# Altium footprint library LDCN Components.PcbLib: 426 footprints (part 17 of 27)
Each footprint in its own frame and in the unit in brackets; x right, y up, seen from the top. Pads: shape width x height; smd on the part's side, far side on the other; paste and mask are expansions set on the pad; w line width, h text height; cw(c..) or ccw(c..) is an arc to the next point about the centre after c.
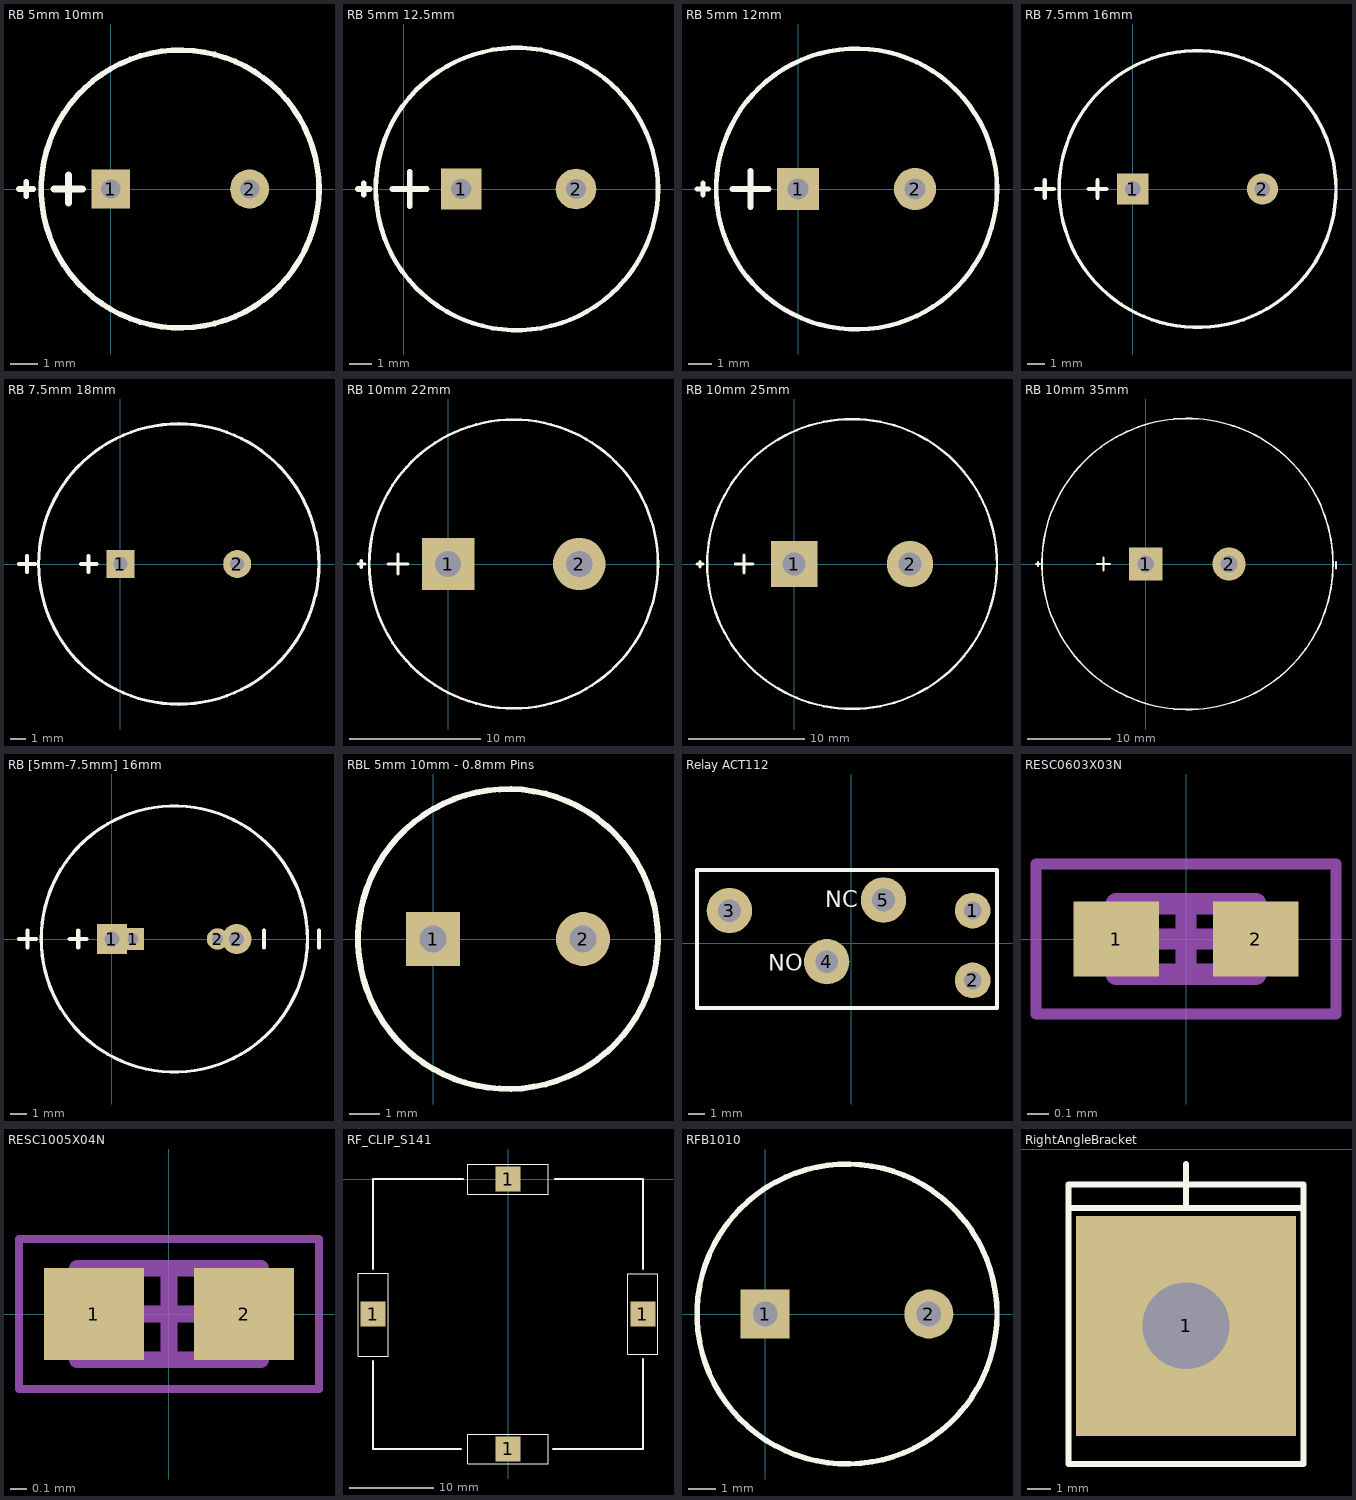
[diagram p16: the footprints below, top view; thin cyan lines are the x and y axes]

## RB 5mm 10mm [mm] "0.7mm Hole"
pads (2):
  rect 1.4x1.4 hole 0.7: 1(0,0)
  round 1.4 hole 0.7: 2(5,0)
Top Overlay:
  circle w0.2: c2.5,0 r5
  lines w0.2: -3.302,0 -2.794,0 ; -3.048,-0.254 -3.048,0.254
  lines w0.254: -2.032,0 -1.016,0 ; -1.524,-0.508 -1.524,0.508

## RB 5mm 12.5mm [mm] "0.9mm Holes"
height 25
pads (2):
  rect 1.8x1.8 hole 0.9: 1(2.54,0)
  round 1.8 hole 0.9: 2(7.62,0)
Top Overlay:
  circle w0.2: c5,0 r6.25
  lines w0.254: -2.032,0 -1.524,0 ; -1.778,-0.254 -1.778,0.254 ; -0.508,0 1.016,0 ; 0.254,-0.762 0.254,0.762

## RB 5mm 12mm [mm] "0.8mm Leads"
height 31
pads (2):
  rect 1.8x1.8 hole 0.9: 1(0,0)
  round 1.8 hole 0.9: 2(5,0)
Top Overlay:
  circle w0.2: c2.5,0 r6
  lines w0.2: -4.318,0 -3.81,0 ; -4.064,-0.254 -4.064,0.254
  lines w0.254: -2.794,0 -1.27,0 ; -2.032,-0.762 -2.032,0.762

## RB 7.5mm 16mm [mm] "Panasonic EE Series - 0.8mm Leads"
height 25
pads (2):
  rect 1.8x1.8 hole 0.9: 1(0,0)
  round 1.8 hole 0.9: 2(7.5,0)
Top Overlay:
  circle w0.2: c3.75,0 r8
  lines w0.254: -5.588,0 -4.572,0 ; -5.08,-0.508 -5.08,0.508 ; -2.54,0 -1.524,0 ; -2.032,-0.508 -2.032,0.508

## RB 7.5mm 18mm [mm] "Panasonic EE Series - 0.8mm Leads"
height 20
pads (2):
  rect 1.8x1.8 hole 0.9: 1(0,0)
  round 1.8 hole 0.9: 2(7.5,0)
Top Overlay:
  circle w0.2: c3.75,0 r9
  lines w0.254: -6.508,0 -5.492,0 ; -6,-0.508 -6,0.508 ; -2.54,0 -1.524,0 ; -2.032,-0.508 -2.032,0.508

## RB 10mm 22mm [mm]
height 25
pads (2):
  rect 4x4 hole 2: 1(0,0)
  round 4 hole 2: 2(10,0)
Top Overlay:
  circle w0.2: c5,0 r11
  lines w0.254: -6.858,0 -6.35,0 ; -6.604,-0.254 -6.604,0.254 ; -4.572,0 -3.048,0 ; -3.81,-0.762 -3.81,0.762

## RB 10mm 25mm [mm]
height 25
pads (2):
  rect 4x4 hole 2: 1(0,0)
  round 4 hole 2: 2(10,0)
Top Overlay:
  circle w0.2: c5,0 r12.5
  lines w0.254: -8.382,0 -7.874,0 ; -8.128,-0.254 -8.128,0.222 ; -5.08,0 -3.556,0 ; -4.318,-0.762 -4.318,0.762

## RB 10mm 35mm [mm] "Snap In 2mm hole"
height 25
pads (2):
  rect 4x4 hole 2: 1(0,0)
  round 4 hole 2: 2(10,0)
Top Overlay:
  circle w0.2: c5,0 r17.5
  lines w0.254: -13.208,0 -12.732,0 ; -12.954,-0.254 -12.954,0.222 ; -5.842,0 -4.318,0 ; -5.08,-0.762 -5.08,0.762 ; 22.86,-0.508 22.86,0.254

## RB [5mm-7.5mm] 16mm [mm] "Panasonic EE Series - [0.6-0.8mm] leads"
height 20
pads (4):
  rect 1.8x1.8 hole 0.9: 1(0,0)
  rect 1.3x1.3 hole 0.65: 1(1.27,0)
  round 1.3 hole 0.65: 2(6.35,0)
  round 1.8 hole 0.9: 2(7.5,0)
Top Overlay:
  circle w0.2: c3.75,0 r8
  lines w0.254: -5.588,0 -4.572,0 ; -5.08,-0.508 -5.08,0.508 ; -2.54,0 -1.524,0 ; -2.032,-0.508 -2.032,0.508 ; 9.144,-0.508 9.144,0.508 ; 12.446,-0.508 12.446,0.508

## RBL 5mm 10mm - 0.8mm Pins [mm] "Panasonic ELC10 Inductor"
pads (2):
  rect 1.8x1.8 hole 0.9: 1(0,0)
  round 1.8 hole 0.9: 2(5,0)
Top Overlay:
  circle w0.2: c2.5,0 r5

## Relay ACT112 [mm] "Panasonic CT Series"
height 13
pads (5):
  round 2.2 hole 1.1: 1(7.5,2) 2(7.5,-2.3)
  round 2.8 hole 1.4: 3(-7.5,2) 4(-1.5,-1.15) 5(2,2.65)
Top Overlay:
  lines w0.254: -9.5,-4 9,-4 9,4.5 -9.5,4.5 -9.5,-4
  text "NO" at -5.1,-1.7 h1.02
  text "NC" at -1.6,2.2 h1.02

## RESC0603X03N [mm] "Chip Resistor, 2-Leads, Body 0.60x0.30mm, IPC Medium Density"
height 0.26
pads (2):
  rect 0.4x0.35 smd: 1(-0.325,0) 2(0.325,0)
Mechanical 13:
  lines w0.1: -0.325,-0.165 -0.325,0.165 0.325,0.165 0.325,-0.165 -0.325,-0.165
Mechanical 15:
  lines w0.05: -0.7,-0.35 -0.7,0.35 0.7,0.35 0.7,-0.35 -0.7,-0.35
  lines w0.1: -0.165,0 0.165,0 ; 0,-0.165 0,0.165
3D body: height 0.26, standoff 0, extent -0.225,-0.165 0.225,0.165
3D body: height 0.26, standoff 0, extent -0.325,-0.165 -0.225,0.165
3D body: height 0.26, standoff 0, extent 0.225,-0.165 0.325,0.165

## RESC1005X04N [mm] "Chip Resistor, 2-Leads, Body 1.00x0.50mm, IPC Medium Density"
height 0.35
pads (2):
  rect 0.6x0.55 smd: 1(-0.45,0) 2(0.45,0)
Mechanical 13:
  lines w0.1: -0.55,-0.275 -0.55,0.275 0.55,0.275 0.55,-0.275 -0.55,-0.275
Mechanical 15:
  lines w0.05: -0.9,-0.45 -0.9,0.45 0.9,0.45 0.9,-0.45 -0.9,-0.45
  lines w0.1: -0.275,0 0.275,0 ; 0,-0.275 0,0.275
3D body: height 0.35, standoff 0, extent -0.35,-0.275 0.35,0.275
3D body: height 0.35, standoff 0, extent -0.55,-0.275 -0.35,0.275
3D body: height 0.35, standoff 0, extent 0.35,-0.275 0.55,0.275

## RF_CLIP_S141 [mm]
pads (4):
  rect 3x3 smd: 1(-16.002,-16.002) 1(0,-32.004) 1(0,0) 1(16.002,-16.002)
Top Overlay:
  lines w0.1: -17.78,-21.018 -14.224,-21.018 -14.224,-11.176 -17.78,-11.176 -17.78,-21.018 ; -4.763,-33.782 -4.763,-30.277 4.763,-30.277 4.763,-33.782 -4.763,-33.782 ; -4.763,-1.778 4.763,-1.778 4.763,1.778 -4.763,1.778 -4.763,-1.778 ; 14.224,-20.764 17.78,-20.764 17.78,-11.239 14.224,-11.239 14.224,-20.764
  lines w0.254: -16.002,-21.59 -16.002,-32.004 -5.588,-32.004 ; -16.002,-10.668 -16.002,0 -5.334,0 ; 5.334,-32.004 16.002,-32.004 16.002,-21.336 ; 5.588,0 16.002,0 16.002,-10.668

## RFB1010 [mm] "Coilcraft Power Inductor"
height 11.5
pads (2):
  rect 1.8x1.8 hole 0.9: 1(0,0)
  round 1.8 hole 0.9: 2(6,0)
Top Overlay:
  circle w0.2: c3,0 r5.5

## RightAngleBracket [mm]
height 20
pads (1):
  rect 9.5x9.5 hole 3.75: 1(81.28,-7.62)
Top Overlay:
  lines w0.254: 76.2,-2.54 86.36,-2.54 ; 81.28,-2.54 81.28,-0.635 ; 76.2,-13.589 76.2,-7.62 76.2,-1.524 86.36,-1.524 86.36,-13.589 76.2,-13.589